# Altium footprint library Connectors THD.PcbLib: 631 footprints (part 21 of 46) (continued)
## HARWIN_M20-7830546 [mm] "10 Contacts, Pitch 2.54mm - Top Entry, Dual Row, Through Mount Socket"
height 8.5
pads (10):
  round 1.7 hole 1: 1(-5.08,1.27) 2(-5.08,-1.27) 3(-2.54,1.27) 4(-2.54,-1.27) 5(0,1.27) 6(0,-1.27) 7(2.54,1.27) 8(2.54,-1.27) 9(5.08,1.27) 10(5.08,-1.27)
Top Overlay:
  circle w0.3: c-5.115,2.935 r0.15
  lines w0.2: -6.55,-2.5 -6.55,2.5 6.55,2.5 6.55,-2.5 -6.55,-2.5
  text "10" at 6.85,-1.85 h1
  text "1" at -7.127,0.772 h1
Mechanical 8:
  lines w0.1: -5.58,-1.27 -5.08,-1.27 ; -5.58,1.27 -5.08,1.27 ; -5.08,-1.77 -5.08,-1.27 ; -5.08,-0.77 -5.08,-1.27 ; -5.08,0.77 -5.08,1.27 ; -5.08,1.77 -5.08,1.27 ; -4.58,-1.27 -5.08,-1.27 ; -4.58,1.27 -5.08,1.27 ; -3.04,-1.27 -2.54,-1.27 ; -3.04,1.27 -2.54,1.27 ; -2.54,-1.77 -2.54,-1.27 ; -2.54,-0.77 -2.54,-1.27 ; -2.54,0.77 -2.54,1.27 ; -2.54,1.77 -2.54,1.27 ; -2.04,-1.27 -2.54,-1.27 ; -2.04,1.27 -2.54,1.27 ; -0.5,-1.27 0,-1.27 ; -0.5,0 0,0 ; -0.5,1.27 0,1.27 ; 0,-1.77 0,-1.27 ; 0,-0.77 0,-1.27 ; 0,-0.5 0,0 ; 0,0.5 0,0 ; 0,0.77 0,1.27 ; 0,1.77 0,1.27 ; 0.5,-1.27 0,-1.27 ; 0.5,0 0,0 ; 0.5,1.27 0,1.27 ; 2.04,-1.27 2.54,-1.27 ; 2.04,1.27 2.54,1.27 ; 2.54,-1.77 2.54,-1.27 ; 2.54,-0.77 2.54,-1.27 ; 2.54,0.77 2.54,1.27 ; 2.54,1.77 2.54,1.27 ; 3.04,-1.27 2.54,-1.27 ; 3.04,1.27 2.54,1.27 ; 4.58,-1.27 5.08,-1.27 ; 4.58,1.27 5.08,1.27 ; 5.08,-1.77 5.08,-1.27 ; 5.08,-0.77 5.08,-1.27 ; 5.08,0.77 5.08,1.27 ; 5.08,1.77 5.08,1.27 ; 5.58,-1.27 5.08,-1.27 ; 5.58,1.27 5.08,1.27
Mechanical 14:
  circle w0.3: c-5.115,2.935 r0.15
  lines w0.1: -5.48,-0.873 -5.98,-0.37 ; -5.48,1.667 -5.98,2.17 ; -2.94,-0.873 -3.44,-0.37 ; -2.94,1.667 -3.44,2.17 ; -0.4,-0.873 -0.9,-0.37 ; -0.4,1.667 -0.9,2.17 ; 2.14,-0.873 1.64,-0.37 ; 2.14,1.667 1.64,2.17 ; 4.68,-0.873 4.18,-0.37 ; 4.68,1.667 4.18,2.17 ; -5.98,-2.17 -5.98,-0.37 ; -5.98,-2.17 -4.18,-2.17 ; -5.98,-2.17 -5.48,-1.67 ; -5.98,-0.37 -4.18,-0.37 ; -5.98,0.37 -5.98,2.17 ; -5.98,0.37 -4.18,0.37 ; -5.98,0.37 -5.48,0.87 ; -5.98,2.17 -4.18,2.17 ; -5.48,-1.67 -4.68,-1.67 ; -5.48,-1.67 -5.48,-0.87 -4.68,-0.87 ; -5.48,0.87 -4.68,0.87 ; -5.48,0.87 -5.48,1.67 -4.68,1.67 ; -4.68,-1.67 -4.18,-2.17 ; -4.68,-1.67 -4.68,-0.87 ; -4.68,-0.87 -4.18,-0.37 ; -4.68,0.87 -4.18,0.37 ; -4.68,0.87 -4.68,1.67 ; -4.68,1.67 -4.18,2.17 ; -4.18,-2.17 -4.18,-0.37 ; -4.18,0.37 -4.18,2.17 ; -3.44,-2.17 -3.44,-0.37 ; -3.44,-2.17 -1.64,-2.17 ; -3.44,-2.17 -2.94,-1.67 ; -3.44,-0.37 -1.64,-0.37 ; -3.44,0.37 -3.44,2.17 ; -3.44,0.37 -1.64,0.37 ; -3.44,0.37 -2.94,0.87 ; -3.44,2.17 -1.64,2.17 ; -2.94,-1.67 -2.14,-1.67 ; -2.94,-1.67 -2.94,-0.87 -2.14,-0.87 ; -2.94,0.87 -2.14,0.87 ; -2.94,0.87 -2.94,1.67 -2.14,1.67 ; -2.14,-1.67 -1.64,-2.17 ; -2.14,-1.67 -2.14,-0.87 ; -2.14,-0.87 -1.64,-0.37 ; -2.14,0.87 -1.64,0.37 ; -2.14,0.87 -2.14,1.67 ; -2.14,1.67 -1.64,2.17 ; -1.64,-2.17 -1.64,-0.37 ; -1.64,0.37 -1.64,2.17 ; -0.9,-2.17 -0.9,-0.37 ; -0.9,-2.17 0.9,-2.17 ; -0.9,-2.17 -0.4,-1.67 ; -0.9,-0.37 0.9,-0.37 ; -0.9,0.37 -0.9,2.17 ; -0.9,0.37 0.9,0.37 ; -0.9,0.37 -0.4,0.87 ; -0.9,2.17 0.9,2.17 ; -0.4,-1.67 0.4,-1.67 ; -0.4,-1.67 -0.4,-0.87 0.4,-0.87 ; -0.4,0.87 0.4,0.87 ; -0.4,0.87 -0.4,1.67 0.4,1.67 ; 0.4,-1.67 0.9,-2.17 ; 0.4,-1.67 0.4,-0.87 ; 0.4,-0.87 0.9,-0.37 ; 0.4,0.87 0.9,0.37 ; 0.4,0.87 0.4,1.67 ; 0.4,1.67 0.9,2.17 ; 0.9,-2.17 0.9,-0.37 ; 0.9,0.37 0.9,2.17 ; 1.64,-2.17 1.64,-0.37 ; 1.64,-2.17 3.44,-2.17 ; 1.64,-2.17 2.14,-1.67 ; 1.64,-0.37 3.44,-0.37 ; 1.64,0.37 1.64,2.17 ; 1.64,0.37 3.44,0.37 ; 1.64,0.37 2.14,0.87 ; 1.64,2.17 3.44,2.17 ; 2.14,-1.67 2.94,-1.67 ; 2.14,-1.67 2.14,-0.87 2.94,-0.87 ; 2.14,0.87 2.94,0.87 ; 2.14,0.87 2.14,1.67 2.94,1.67 ; 2.94,-1.67 3.44,-2.17 ; 2.94,-1.67 2.94,-0.87 ; 2.94,-0.87 3.44,-0.37 ; 2.94,0.87 3.44,0.37 ; 2.94,0.87 2.94,1.67 ; 2.94,1.67 3.44,2.17 ; 3.44,-2.17 3.44,-0.37 ; 3.44,0.37 3.44,2.17 ; 4.18,-2.17 4.18,-0.37 ; 4.18,-2.17 5.98,-2.17 ; 4.18,-2.17 4.68,-1.67 ; 4.18,-0.37 5.98,-0.37 ; 4.18,0.37 4.18,2.17 ; 4.18,0.37 5.98,0.37 ; 4.18,0.37 4.68,0.87 ; 4.18,2.17 5.98,2.17 ; 4.68,-1.67 5.48,-1.67 ; 4.68,-1.67 4.68,-0.87 5.48,-0.87 ; 4.68,0.87 5.48,0.87 ; 4.68,0.87 4.68,1.67 5.48,1.67 ; 5.48,-1.67 5.98,-2.17 ; 5.48,-1.67 5.48,-0.87 ; 5.48,-0.87 5.98,-0.37 ; 5.48,0.87 5.98,0.37 ; 5.48,0.87 5.48,1.67 ; 5.48,1.67 5.98,2.17 ; 5.98,-2.17 5.98,-0.37 ; 5.98,0.37 5.98,2.17 ; -6.55,-2.5 -6.55,2.5 6.55,2.5 6.55,-2.5 -6.55,-2.5
  text "10" at 6.85,-1.85 h1
  text "1" at -7.127,0.772 h1
3D body: height 8.5, standoff -3, extent -6.55,-2.5 6.55,2.5

## HARWIN_M20-9990246 [mm] "2 Contacts, Pitch 2.54mm - Male Vertical Single row Pc tail"
height 8.68
pads (2):
  round 1.7 hole 1: 1(0,0) 2(2.54,0)
Top Overlay:
  circle w0.3: c-0.508,1.778 r0.15
  lines w0.2: 1.27,-0.77 1.77,-1.27 3.31,-1.27 3.81,-0.77 3.81,0.77 3.31,1.27 1.77,1.27 1.27,0.77 ; 1.27,-0.77 0.77,-1.27 -0.77,-1.27 -1.27,-0.77 -1.27,0.77 -0.77,1.27 0.77,1.27 1.27,0.77 ; 1.27,-0.77 1.27,0.77
Mechanical 8:
  lines w0.1: -0.5,0 0,0 ; 0,-0.5 0,0 ; 0,0.5 0,0 ; 0.5,0 0,0 ; 2.04,0 2.54,0 ; 2.54,-0.5 2.54,0 ; 2.54,0.5 2.54,0 ; 3.04,0 2.54,0
Mechanical 14:
  circle w0.3: c-0.508,1.778 r0.15
  lines w0.1: 1.27,-0.77 1.77,-1.27 3.31,-1.27 3.81,-0.77 3.81,0.77 3.31,1.27 1.77,1.27 1.27,0.77 ; 1.27,-0.77 0.77,-1.27 -0.77,-1.27 -1.27,-0.77 -1.27,0.77 -0.77,1.27 0.77,1.27 1.27,0.77 ; 1.27,-0.77 1.27,0.77
3D body: height 8.64, standoff -3.04, extent -1.27,-1.27 3.81,1.27

## HARWIN_M22-F2010605 [mm] "6 Contacts, Pitch 2mm - SIL Vertical Pin Header"
height 5
pads (6):
  round 1.5 hole 0.8: 1(0,0) 2(2,0) 3(4,0) 4(6,0) 5(8,0) 6(10,0)
Top Overlay:
  circle w0.3: c-0.508,1.778 r0.15
  lines w0.2: -1,-0.75 -0.75,-1 0.75,-1 1,-0.75 1.25,-1 2.75,-1 3,-0.75 3.25,-1 4.75,-1 5,-0.75 5.25,-1 6.75,-1 7,-0.75 7.25,-1 8.75,-1 9,-0.75 9.25,-1 10.75,-1 11,-0.75 11,0.75 10.75,1 9.25,1 9,0.75 8.75,1 7.25,1 7,0.75 6.75,1 5.25,1 5,0.75 4.75,1 3.25,1 3,0.75 2.75,1 1.25,1 1,0.75 0.75,1 -0.75,1 -1,0.75 -1,-0.75
Mechanical 8:
  lines w0.1: -0.5,0 0,0 ; 0,-0.5 0,0 ; 0,0.5 0,0 ; 0.5,0 0,0 ; 1.5,0 2,0 ; 2,-0.5 2,0 ; 2,0.5 2,0 ; 2.5,0 2,0 ; 3.5,0 4,0 ; 4,-0.5 4,0 ; 4,0.5 4,0 ; 4.5,0 4,0 ; 5.5,0 6,0 ; 6,-0.5 6,0 ; 6,0.5 6,0 ; 6.5,0 6,0 ; 7.5,0 8,0 ; 8,-0.5 8,0 ; 8,0.5 8,0 ; 8.5,0 8,0 ; 9.5,0 10,0 ; 10,-0.5 10,0 ; 10,0.5 10,0 ; 10.5,0 10,0
Mechanical 14:
  circle w0.3: c-0.508,1.778 r0.15
  lines w0.1: -1,-0.75 -0.75,-1 0.75,-1 1,-0.75 1.25,-1 2.75,-1 3,-0.75 3.25,-1 4.75,-1 5,-0.75 5.25,-1 6.75,-1 7,-0.75 7.25,-1 8.75,-1 9,-0.75 9.25,-1 10.75,-1 11,-0.75 11,0.75 10.75,1 9.25,1 9,0.75 8.75,1 7.25,1 7,0.75 6.75,1 5.25,1 5,0.75 4.75,1 3.25,1 3,0.75 2.75,1 1.25,1 1,0.75 0.75,1 -0.75,1 -1,0.75 -1,-0.75
3D body: height 5, standoff -3.4, extent -1,-1 11,1

## HARWIN_M50-3001045 [mm] "20 Contacts, Pitch 1.27mm - Top Entry, Dual Row Through Mount Socket"
height 4.55
pads (20):
  rrect50% 1.05x1.05 hole 0.65: 1(-5.715,0.635) 2(-5.715,-0.635) 3(-4.445,0.635) 4(-4.445,-0.635) 5(-3.175,0.635) 6(-3.175,-0.635) 7(-1.905,0.635) 8(-1.905,-0.635) 9(-0.635,0.635) 10(-0.635,-0.635) 11(0.635,0.635) 12(0.635,-0.635) 13(1.905,0.635) 14(1.905,-0.635) 15(3.175,0.635) 16(3.175,-0.635) 17(4.445,0.635) 18(4.445,-0.635) 19(5.715,0.635) 20(5.715,-0.635)
Top Overlay:
  circle w0.3: c-5.75,2 r0.15
  lines w0.2: -6.75,-1.625 6.75,-1.625 6.75,1.625 -6.75,1.625 -6.75,-1.625
  text "20" at 7,-1.1 h1
  text "1" at -7.362,0.162 h1
Mechanical 8:
  lines w0.1: -6.215,-0.635 -5.715,-0.635 ; -6.215,0.635 -5.715,0.635 ; -5.715,-1.135 -5.715,-0.635 ; -5.715,-0.135 -5.715,-0.635 ; -5.715,0.135 -5.715,0.635 ; -5.715,1.135 -5.715,0.635 ; -5.215,-0.635 -5.715,-0.635 ; -5.215,0.635 -5.715,0.635 ; -4.945,-0.635 -4.445,-0.635 ; -4.945,0.635 -4.445,0.635 ; -4.445,-1.135 -4.445,-0.635 ; -4.445,-0.135 -4.445,-0.635 ; -4.445,0.135 -4.445,0.635 ; -4.445,1.135 -4.445,0.635 ; -3.945,-0.635 -4.445,-0.635 ; -3.945,0.635 -4.445,0.635 ; -3.675,-0.635 -3.175,-0.635 ; -3.675,0.635 -3.175,0.635 ; -3.175,-1.135 -3.175,-0.635 ; -3.175,-0.135 -3.175,-0.635 ; -3.175,0.135 -3.175,0.635 ; -3.175,1.135 -3.175,0.635 ; -2.675,-0.635 -3.175,-0.635 ; -2.675,0.635 -3.175,0.635 ; -2.405,-0.635 -1.905,-0.635 ; -2.405,0.635 -1.905,0.635 ; -1.905,-1.135 -1.905,-0.635 ; -1.905,-0.135 -1.905,-0.635 ; -1.905,0.135 -1.905,0.635 ; -1.905,1.135 -1.905,0.635 ; -1.405,-0.635 -1.905,-0.635 ; -1.405,0.635 -1.905,0.635 ; -1.135,-0.635 -0.635,-0.635 ; -1.135,0.635 -0.635,0.635 ; -1,0 0,0 ; -0.635,-1.135 -0.635,-0.635 ; -0.635,-0.135 -0.635,-0.635 ; -0.635,0.135 -0.635,0.635 ; -0.635,1.135 -0.635,0.635 ; -0.135,-0.635 -0.635,-0.635 ; -0.135,0.635 -0.635,0.635 ; 0,-1 0,0 ; 0,1 0,0 ; 0.135,-0.635 0.635,-0.635 ; 0.135,0.635 0.635,0.635 ; 0.635,-1.135 0.635,-0.635 ; 0.635,-0.135 0.635,-0.635 ; 0.635,0.135 0.635,0.635 ; 0.635,1.135 0.635,0.635 ; 1,0 0,0 ; 1.135,-0.635 0.635,-0.635 ; 1.135,0.635 0.635,0.635 ; 1.405,-0.635 1.905,-0.635 ; 1.405,0.635 1.905,0.635 ; 1.905,-1.135 1.905,-0.635 ; 1.905,-0.135 1.905,-0.635 ; 1.905,0.135 1.905,0.635 ; 1.905,1.135 1.905,0.635 ; 2.405,-0.635 1.905,-0.635 ; 2.405,0.635 1.905,0.635 ; 2.675,-0.635 3.175,-0.635 ; 2.675,0.635 3.175,0.635 ; 3.175,-1.135 3.175,-0.635 ; 3.175,-0.135 3.175,-0.635 ; 3.175,0.135 3.175,0.635 ; 3.175,1.135 3.175,0.635 ; 3.675,-0.635 3.175,-0.635 ; 3.675,0.635 3.175,0.635 ; 3.945,-0.635 4.445,-0.635 ; 3.945,0.635 4.445,0.635 ; 4.445,-1.135 4.445,-0.635 ; 4.445,-0.135 4.445,-0.635 ; 4.445,0.135 4.445,0.635 ; 4.445,1.135 4.445,0.635 ; 4.945,-0.635 4.445,-0.635 ; 4.945,0.635 4.445,0.635 ; 5.215,-0.635 5.715,-0.635 ; 5.215,0.635 5.715,0.635 ; 5.715,-1.135 5.715,-0.635 ; 5.715,-0.135 5.715,-0.635 ; 5.715,0.135 5.715,0.635 ; 5.715,1.135 5.715,0.635 ; 6.215,-0.635 5.715,-0.635 ; 6.215,0.635 5.715,0.635
Mechanical 14:
  drawing of 245 lines, arcs and shapes, not listed
  text "20" at 7,-1.1 h1
  text "1" at -7.362,0.162 h1
3D body: height 4.55, standoff -2.4, extent -6.75,-1.625 6.75,1.625

## HARWIN_M50-3501042 [mm] "20 Contacts, Pitch 1.27mm - Horizontal, Dual Row Through Mount Right Angle Straight Header"
height 4.15
pads (20):
  rrect50% 1.05x1.05 hole 0.65: 1(-5.715,-0.635) 2(-5.715,0.635) 3(-4.445,-0.635) 4(-4.445,0.635) 5(-3.175,-0.635) 6(-3.175,0.635) 7(-1.905,-0.635) 8(-1.905,0.635) 9(-0.635,-0.635) 10(-0.635,0.635) 11(0.635,-0.635) 12(0.635,0.635) 13(1.905,-0.635) 14(1.905,0.635) 15(3.175,-0.635) 16(3.175,0.635) 17(4.445,-0.635) 18(4.445,0.635) 19(5.715,-0.635) 20(5.715,0.635)
Top Overlay:
  circle w0.3: c-5.725,-2.275 r0.15
  lines w0.2: -6.35,-1.308 -6.35,-1.7 6.35,-1.7 6.35,-1.308 ; -6.35,1.308 -6.35,1.7 6.35,1.7 6.35,1.308
  text "1" at -6.862,-1.038 h0.8
  text "20" at 6.5,0.2 h0.8
Mechanical 8:
  lines w0.1: -6.215,-0.635 -5.715,-0.635 ; -6.215,0.635 -5.715,0.635 ; -5.715,-1.135 -5.715,-0.635 ; -5.715,-0.135 -5.715,-0.635 ; -5.715,0.135 -5.715,0.635 ; -5.715,1.135 -5.715,0.635 ; -5.215,-0.635 -5.715,-0.635 ; -5.215,0.635 -5.715,0.635 ; -4.945,-0.635 -4.445,-0.635 ; -4.945,0.635 -4.445,0.635 ; -4.445,-1.135 -4.445,-0.635 ; -4.445,-0.135 -4.445,-0.635 ; -4.445,0.135 -4.445,0.635 ; -4.445,1.135 -4.445,0.635 ; -3.945,-0.635 -4.445,-0.635 ; -3.945,0.635 -4.445,0.635 ; -3.675,-0.635 -3.175,-0.635 ; -3.675,0.635 -3.175,0.635 ; -3.175,-1.135 -3.175,-0.635 ; -3.175,-0.135 -3.175,-0.635 ; -3.175,0.135 -3.175,0.635 ; -3.175,1.135 -3.175,0.635 ; -2.675,-0.635 -3.175,-0.635 ; -2.675,0.635 -3.175,0.635 ; -2.405,-0.635 -1.905,-0.635 ; -2.405,0.635 -1.905,0.635 ; -1.905,-1.135 -1.905,-0.635 ; -1.905,-0.135 -1.905,-0.635 ; -1.905,0.135 -1.905,0.635 ; -1.905,1.135 -1.905,0.635 ; -1.405,-0.635 -1.905,-0.635 ; -1.405,0.635 -1.905,0.635 ; -1.135,-0.635 -0.635,-0.635 ; -1.135,0.635 -0.635,0.635 ; -1,0 0,0 ; -0.635,-1.135 -0.635,-0.635 ; -0.635,-0.135 -0.635,-0.635 ; -0.635,0.135 -0.635,0.635 ; -0.635,1.135 -0.635,0.635 ; -0.135,-0.635 -0.635,-0.635 ; -0.135,0.635 -0.635,0.635 ; 0,-1 0,0 ; 0,1 0,0 ; 0.135,-0.635 0.635,-0.635 ; 0.135,0.635 0.635,0.635 ; 0.635,-1.135 0.635,-0.635 ; 0.635,-0.135 0.635,-0.635 ; 0.635,0.135 0.635,0.635 ; 0.635,1.135 0.635,0.635 ; 1,0 0,0 ; 1.135,-0.635 0.635,-0.635 ; 1.135,0.635 0.635,0.635 ; 1.405,-0.635 1.905,-0.635 ; 1.405,0.635 1.905,0.635 ; 1.905,-1.135 1.905,-0.635 ; 1.905,-0.135 1.905,-0.635 ; 1.905,0.135 1.905,0.635 ; 1.905,1.135 1.905,0.635 ; 2.405,-0.635 1.905,-0.635 ; 2.405,0.635 1.905,0.635 ; 2.675,-0.635 3.175,-0.635 ; 2.675,0.635 3.175,0.635 ; 3.175,-1.135 3.175,-0.635 ; 3.175,-0.135 3.175,-0.635 ; 3.175,0.135 3.175,0.635 ; 3.175,1.135 3.175,0.635 ; 3.675,-0.635 3.175,-0.635 ; 3.675,0.635 3.175,0.635 ; 3.945,-0.635 4.445,-0.635 ; 3.945,0.635 4.445,0.635 ; 4.445,-1.135 4.445,-0.635 ; 4.445,-0.135 4.445,-0.635 ; 4.445,0.135 4.445,0.635 ; 4.445,1.135 4.445,0.635 ; 4.945,-0.635 4.445,-0.635 ; 4.945,0.635 4.445,0.635 ; 5.215,-0.635 5.715,-0.635 ; 5.215,0.635 5.715,0.635 ; 5.715,-1.135 5.715,-0.635 ; 5.715,-0.135 5.715,-0.635 ; 5.715,0.135 5.715,0.635 ; 5.715,1.135 5.715,0.635 ; 6.215,-0.635 5.715,-0.635 ; 6.215,0.635 5.715,0.635
Mechanical 14:
  drawing of 254 lines, arcs and shapes, not listed
  text "1" at -6.862,-1.038 h0.8
  text "20" at 6.5,0.2 h0.8
3D body: height 4, standoff -2.3, extent -6.35,-1.7 6.35,1.7

## HARWIN_M50-3901042 [mm] "20 Contacts, Pitch 1.27mm - Horizontal, Dual Row Through Mount Right Angle Header"
height 3.41
pads (20):
  rrect50% 1.05x1.05 hole 0.65: 1(-5.715,-0.635) 2(-5.715,0.635) 3(-4.445,-0.635) 4(-4.445,0.635) 5(-3.175,-0.635) 6(-3.175,0.635) 7(-1.905,-0.635) 8(-1.905,0.635) 9(-0.635,-0.635) 10(-0.635,0.635) 11(0.635,-0.635) 12(0.635,0.635) 13(1.905,-0.635) 14(1.905,0.635) 15(3.175,-0.635) 16(3.175,0.635) 17(4.445,-0.635) 18(4.445,0.635) 19(5.715,-0.635) 20(5.715,0.635)
Top Overlay:
  circle w0.3: c-5.75,-1.6 r0.15
  lines w0.2: -5.915,3.135 -5.915,1.41 -5.515,1.41 -5.515,3.135 ; -5.915,4.135 -5.915,7.835 ; -5.515,4.135 -5.515,7.835 ; -4.645,3.135 -4.645,1.41 -4.245,1.41 -4.245,3.135 ; -4.645,4.135 -4.645,7.835 ; -4.245,4.135 -4.245,7.835 ; -3.375,3.135 -3.375,1.41 -2.975,1.41 -2.975,3.135 ; -3.375,4.135 -3.375,7.835 ; -2.975,4.135 -2.975,7.835 ; -2.105,3.135 -2.105,1.41 -1.705,1.41 -1.705,3.135 ; -2.105,4.135 -2.105,7.835 ; -1.705,4.135 -1.705,7.835 ; -0.835,3.135 -0.835,1.41 -0.435,1.41 -0.435,3.135 ; -0.835,4.135 -0.835,7.835 ; -0.435,4.135 -0.435,7.835 ; 0.435,3.135 0.435,1.41 0.835,1.41 0.835,3.135 ; 0.435,4.135 0.435,7.835 ; 0.835,4.135 0.835,7.835 ; 1.705,3.135 1.705,1.41 2.105,1.41 2.105,3.135 ; 1.705,4.135 1.705,7.835 ; 2.105,4.135 2.105,7.835 ; 2.975,3.135 2.975,1.41 3.375,1.41 3.375,3.135 ; 2.975,4.135 2.975,7.835 ; 3.375,4.135 3.375,7.835 ; 4.245,3.135 4.245,1.41 4.645,1.41 4.645,3.135 ; 4.245,4.135 4.245,7.835 ; 4.645,4.135 4.645,7.835 ; 5.515,3.135 5.515,1.41 5.915,1.41 5.915,3.135 ; 5.515,4.135 5.515,7.835 ; 5.915,4.135 5.915,7.835 ; -6.3,3.135 -5.13,3.135 -5.03,3.235 -4.93,3.135 -3.86,3.135 -3.76,3.235 -3.66,3.135 -2.59,3.135 -2.49,3.235 -2.39,3.135 -1.32,3.135 -1.22,3.235 -1.12,3.135 -0.05,3.135 0.05,3.235 0.15,3.135 1.22,3.135 1.32,3.235 1.42,3.135 2.49,3.135 2.59,3.235 2.69,3.135 3.76,3.135 3.86,3.235 3.96,3.135 5.03,3.135 5.13,3.235 5.23,3.135 6.4,3.135 6.4,4.135 5.23,4.135 5.13,4.035 5.03,4.135 3.96,4.135 3.86,4.035 3.76,4.135 2.69,4.135 2.59,4.035 2.49,4.135 1.42,4.135 1.32,4.035 1.22,4.135 0.15,4.135 0.05,4.035 -0.05,4.135 -1.12,4.135 -1.22,4.035 -1.32,4.135 -2.39,4.135 -2.49,4.035 -2.59,4.135 -3.66,4.135 -3.76,4.035 -3.86,4.135 -4.93,4.135 -5.03,4.035 -5.13,4.135 -6.3,4.135 ; -6.3,3.135 -6.3,4.135 ; -6.3,3.135 -6.3,4.135 ; -5.915,7.835 -5.515,7.835 ; -5.915,7.835 -5.815,7.935 -5.615,7.935 -5.515,7.835 ; -4.645,7.835 -4.245,7.835 ; -4.645,7.835 -4.545,7.935 -4.345,7.935 -4.245,7.835 ; -3.375,7.835 -2.975,7.835 ; -3.375,7.835 -3.275,7.935 -3.075,7.935 -2.975,7.835 ; -2.105,7.835 -1.705,7.835 ; -2.105,7.835 -2.005,7.935 -1.805,7.935 -1.705,7.835 ; -0.835,7.835 -0.435,7.835 ; -0.835,7.835 -0.735,7.935 -0.535,7.935 -0.435,7.835 ; 0.435,7.835 0.835,7.835 ; 0.435,7.835 0.535,7.935 0.735,7.935 0.835,7.835 ; 1.705,7.835 2.105,7.835 ; 1.705,7.835 1.805,7.935 2.005,7.935 2.105,7.835 ; 2.975,7.835 3.375,7.835 ; 2.975,7.835 3.075,7.935 3.275,7.935 3.375,7.835 ; 4.245,7.835 4.645,7.835 ; 4.245,7.835 4.345,7.935 4.545,7.935 4.645,7.835 ; 5.515,7.835 5.915,7.835 ; 5.515,7.835 5.615,7.935 5.815,7.935 5.915,7.835
  text "1" at -6.862,-1.038 h0.8
  text "20" at 6.5,0.2 h0.8
Mechanical 8:
  lines w0.1: -6.215,-0.635 -5.715,-0.635 ; -6.215,0.635 -5.715,0.635 ; -5.715,-1.135 -5.715,-0.635 ; -5.715,-0.135 -5.715,-0.635 ; -5.715,0.135 -5.715,0.635 ; -5.715,1.135 -5.715,0.635 ; -5.215,-0.635 -5.715,-0.635 ; -5.215,0.635 -5.715,0.635 ; -4.945,-0.635 -4.445,-0.635 ; -4.945,0.635 -4.445,0.635 ; -4.445,-1.135 -4.445,-0.635 ; -4.445,-0.135 -4.445,-0.635 ; -4.445,0.135 -4.445,0.635 ; -4.445,1.135 -4.445,0.635 ; -3.945,-0.635 -4.445,-0.635 ; -3.945,0.635 -4.445,0.635 ; -3.675,-0.635 -3.175,-0.635 ; -3.675,0.635 -3.175,0.635 ; -3.175,-1.135 -3.175,-0.635 ; -3.175,-0.135 -3.175,-0.635 ; -3.175,0.135 -3.175,0.635 ; -3.175,1.135 -3.175,0.635 ; -2.675,-0.635 -3.175,-0.635 ; -2.675,0.635 -3.175,0.635 ; -2.405,-0.635 -1.905,-0.635 ; -2.405,0.635 -1.905,0.635 ; -1.905,-1.135 -1.905,-0.635 ; -1.905,-0.135 -1.905,-0.635 ; -1.905,0.135 -1.905,0.635 ; -1.905,1.135 -1.905,0.635 ; -1.405,-0.635 -1.905,-0.635 ; -1.405,0.635 -1.905,0.635 ; -1.135,-0.635 -0.635,-0.635 ; -1.135,0.635 -0.635,0.635 ; -1,0 0,0 ; -0.635,-1.135 -0.635,-0.635 ; -0.635,-0.135 -0.635,-0.635 ; -0.635,0.135 -0.635,0.635 ; -0.635,1.135 -0.635,0.635 ; -0.135,-0.635 -0.635,-0.635 ; -0.135,0.635 -0.635,0.635 ; 0,-1 0,0 ; 0,1 0,0 ; 0.135,-0.635 0.635,-0.635 ; 0.135,0.635 0.635,0.635 ; 0.635,-1.135 0.635,-0.635 ; 0.635,-0.135 0.635,-0.635 ; 0.635,0.135 0.635,0.635 ; 0.635,1.135 0.635,0.635 ; 1,0 0,0 ; 1.135,-0.635 0.635,-0.635 ; 1.135,0.635 0.635,0.635 ; 1.405,-0.635 1.905,-0.635 ; 1.405,0.635 1.905,0.635 ; 1.905,-1.135 1.905,-0.635 ; 1.905,-0.135 1.905,-0.635 ; 1.905,0.135 1.905,0.635 ; 1.905,1.135 1.905,0.635 ; 2.405,-0.635 1.905,-0.635 ; 2.405,0.635 1.905,0.635 ; 2.675,-0.635 3.175,-0.635 ; 2.675,0.635 3.175,0.635 ; 3.175,-1.135 3.175,-0.635 ; 3.175,-0.135 3.175,-0.635 ; 3.175,0.135 3.175,0.635 ; 3.175,1.135 3.175,0.635 ; 3.675,-0.635 3.175,-0.635 ; 3.675,0.635 3.175,0.635 ; 3.945,-0.635 4.445,-0.635 ; 3.945,0.635 4.445,0.635 ; 4.445,-1.135 4.445,-0.635 ; 4.445,-0.135 4.445,-0.635 ; 4.445,0.135 4.445,0.635 ; 4.445,1.135 4.445,0.635 ; 4.945,-0.635 4.445,-0.635 ; 4.945,0.635 4.445,0.635 ; 5.215,-0.635 5.715,-0.635 ; 5.215,0.635 5.715,0.635 ; 5.715,-1.135 5.715,-0.635 ; 5.715,-0.135 5.715,-0.635 ; 5.715,0.135 5.715,0.635 ; 5.715,1.135 5.715,0.635 ; 6.215,-0.635 5.715,-0.635 ; 6.215,0.635 5.715,0.635
Mechanical 14:
  circle w0.3: c-5.75,-1.6 r0.15
  lines w0.1: -5.915,3.135 -5.915,-0.835 -5.515,-0.835 -5.515,3.135 ; -5.915,4.135 -5.915,7.835 ; -5.515,4.135 -5.515,7.835 ; -4.645,3.135 -4.645,-0.835 -4.245,-0.835 -4.245,3.135 ; -4.645,4.135 -4.645,7.835 ; -4.245,4.135 -4.245,7.835 ; -3.375,3.135 -3.375,-0.835 -2.975,-0.835 -2.975,3.135 ; -3.375,4.135 -3.375,7.835 ; -2.975,4.135 -2.975,7.835 ; -2.105,3.135 -2.105,-0.835 -1.705,-0.835 -1.705,3.135 ; -2.105,4.135 -2.105,7.835 ; -1.705,4.135 -1.705,7.835 ; -0.835,3.135 -0.835,-0.835 -0.435,-0.835 -0.435,3.135 ; -0.835,4.135 -0.835,7.835 ; -0.435,4.135 -0.435,7.835 ; 0.435,3.135 0.435,-0.835 0.835,-0.835 0.835,3.135 ; 0.435,4.135 0.435,7.835 ; 0.835,4.135 0.835,7.835 ; 1.705,3.135 1.705,-0.835 2.105,-0.835 2.105,3.135 ; 1.705,4.135 1.705,7.835 ; 2.105,4.135 2.105,7.835 ; 2.975,3.135 2.975,-0.835 3.375,-0.835 3.375,3.135 ; 2.975,4.135 2.975,7.835 ; 3.375,4.135 3.375,7.835 ; 4.245,3.135 4.245,-0.835 4.645,-0.835 4.645,3.135 ; 4.245,4.135 4.245,7.835 ; 4.645,4.135 4.645,7.835 ; 5.515,3.135 5.515,-0.835 5.915,-0.835 5.915,3.135 ; 5.515,4.135 5.515,7.835 ; 5.915,4.135 5.915,7.835 ; -6.3,3.135 -6.3,4.135 ; -6.3,3.135 -5.13,3.135 -5.03,3.235 -4.93,3.135 -3.86,3.135 -3.76,3.235 -3.66,3.135 -2.59,3.135 -2.49,3.235 -2.39,3.135 -1.32,3.135 -1.22,3.235 -1.12,3.135 -0.05,3.135 0.05,3.235 0.15,3.135 1.22,3.135 1.32,3.235 1.42,3.135 2.49,3.135 2.59,3.235 2.69,3.135 3.76,3.135 3.86,3.235 3.96,3.135 5.03,3.135 5.13,3.235 5.23,3.135 6.4,3.135 6.4,4.135 5.23,4.135 5.13,4.035 5.03,4.135 3.96,4.135 3.86,4.035 3.76,4.135 2.69,4.135 2.59,4.035 2.49,4.135 1.42,4.135 1.32,4.035 1.22,4.135 0.15,4.135 0.05,4.035 -0.05,4.135 -1.12,4.135 -1.22,4.035 -1.32,4.135 -2.39,4.135 -2.49,4.035 -2.59,4.135 -3.66,4.135 -3.76,4.035 -3.86,4.135 -4.93,4.135 -5.03,4.035 -5.13,4.135 -6.3,4.135 ; -6.3,3.135 -6.3,4.135 ; -5.915,7.835 -5.515,7.835 ; -5.915,7.835 -5.815,7.935 -5.615,7.935 -5.515,7.835 ; -4.645,7.835 -4.245,7.835 ; -4.645,7.835 -4.545,7.935 -4.345,7.935 -4.245,7.835 ; -3.375,7.835 -2.975,7.835 ; -3.375,7.835 -3.275,7.935 -3.075,7.935 -2.975,7.835 ; -2.105,7.835 -1.705,7.835 ; -2.105,7.835 -2.005,7.935 -1.805,7.935 -1.705,7.835 ; -0.835,7.835 -0.435,7.835 ; -0.835,7.835 -0.735,7.935 -0.535,7.935 -0.435,7.835 ; 0.435,7.835 0.835,7.835 ; 0.435,7.835 0.535,7.935 0.735,7.935 0.835,7.835 ; 1.705,7.835 2.105,7.835 ; 1.705,7.835 1.805,7.935 2.005,7.935 2.105,7.835 ; 2.975,7.835 3.375,7.835 ; 2.975,7.835 3.075,7.935 3.275,7.935 3.375,7.835 ; 4.245,7.835 4.645,7.835 ; 4.245,7.835 4.345,7.935 4.545,7.935 4.645,7.835 ; 5.515,7.835 5.915,7.835 ; 5.515,7.835 5.615,7.935 5.815,7.935 5.915,7.835
  text "1" at -6.862,-1.038 h0.8
  text "20" at 6.5,0.2 h0.8
3D body: height 3.41, standoff -2, extent -6.3,-0.835 6.4,7.935

## HARWIN_M52-5001545 [mm] "1.27mm Pitch SIL Vertical PC Tail Socket"
height 4.8
pads (15):
  rrect50% 1.05x1.05 hole 0.65: 1(0,0) 2(1.27,0) 3(2.54,0) 4(3.81,0) 5(5.08,0) 6(6.35,0) 7(7.62,0) 8(8.89,0) 9(10.16,0) 10(11.43,0) 11(12.7,0) 12(13.97,0) 13(15.24,0) 14(16.51,0) 15(17.78,0)
Top Overlay:
  circle w0.3: c-0.508,1.778 r0.15
  lines w0.2: -0.635,-0.773 -0.635,-1.05 -0.385,-1.3 0.385,-1.3 0.635,-1.05 0.885,-1.3 1.655,-1.3 1.905,-1.05 2.155,-1.3 2.925,-1.3 3.175,-1.05 3.425,-1.3 4.195,-1.3 4.445,-1.05 4.695,-1.3 5.465,-1.3 5.715,-1.05 5.965,-1.3 6.735,-1.3 6.985,-1.05 7.235,-1.3 8.005,-1.3 8.255,-1.05 8.505,-1.3 9.275,-1.3 9.525,-1.05 9.775,-1.3 10.545,-1.3 10.795,-1.05 11.045,-1.3 11.815,-1.3 12.065,-1.05 12.315,-1.3 13.085,-1.3 13.335,-1.05 13.585,-1.3 14.355,-1.3 14.605,-1.05 14.855,-1.3 15.625,-1.3 15.875,-1.05 16.125,-1.3 16.895,-1.3 17.145,-1.05 17.395,-1.3 18.165,-1.3 18.415,-1.05 18.415,-0.773 ; -0.635,0.773 -0.635,1.05 -0.385,1.3 0.385,1.3 0.635,1.05 0.885,1.3 1.655,1.3 1.905,1.05 2.155,1.3 2.925,1.3 3.175,1.05 3.425,1.3 4.195,1.3 4.445,1.05 4.695,1.3 5.465,1.3 5.715,1.05 5.965,1.3 6.735,1.3 6.985,1.05 7.235,1.3 8.005,1.3 8.255,1.05 8.505,1.3 9.275,1.3 9.525,1.05 9.775,1.3 10.545,1.3 10.795,1.05 11.045,1.3 11.815,1.3 12.065,1.05 12.315,1.3 13.085,1.3 13.335,1.05 13.585,1.3 14.355,1.3 14.605,1.05 14.855,1.3 15.625,1.3 15.875,1.05 16.125,1.3 16.895,1.3 17.145,1.05 17.395,1.3 18.165,1.3 18.415,1.05 18.415,0.773
Mechanical 8:
  lines w0.1: -0.5,0 0,0 ; 0,-0.5 0,0 ; 0,0.5 0,0 ; 0.5,0 0,0 ; 0.77,0 1.27,0 ; 1.27,-0.5 1.27,0 ; 1.27,0.5 1.27,0 ; 1.77,0 1.27,0 ; 2.04,0 2.54,0 ; 2.54,-0.5 2.54,0 ; 2.54,0.5 2.54,0 ; 3.04,0 2.54,0 ; 3.31,0 3.81,0 ; 3.81,-0.5 3.81,0 ; 3.81,0.5 3.81,0 ; 4.31,0 3.81,0 ; 4.58,0 5.08,0 ; 5.08,-0.5 5.08,0 ; 5.08,0.5 5.08,0 ; 5.58,0 5.08,0 ; 5.85,0 6.35,0 ; 6.35,-0.5 6.35,0 ; 6.35,0.5 6.35,0 ; 6.85,0 6.35,0 ; 7.12,0 7.62,0 ; 7.62,-0.5 7.62,0 ; 7.62,0.5 7.62,0 ; 8.12,0 7.62,0 ; 8.39,0 8.89,0 ; 8.89,-0.5 8.89,0 ; 8.89,0.5 8.89,0 ; 9.39,0 8.89,0 ; 9.66,0 10.16,0 ; 10.16,-0.5 10.16,0 ; 10.16,0.5 10.16,0 ; 10.66,0 10.16,0 ; 10.93,0 11.43,0 ; 11.43,-0.5 11.43,0 ; 11.43,0.5 11.43,0 ; 11.93,0 11.43,0 ; 12.2,0 12.7,0 ; 12.7,-0.5 12.7,0 ; 12.7,0.5 12.7,0 ; 13.2,0 12.7,0 ; 13.47,0 13.97,0 ; 13.97,-0.5 13.97,0 ; 13.97,0.5 13.97,0 ; 14.47,0 13.97,0 ; 14.74,0 15.24,0 ; 15.24,-0.5 15.24,0 ; 15.24,0.5 15.24,0 ; 15.74,0 15.24,0 ; 16.01,0 16.51,0 ; 16.51,-0.5 16.51,0 ; 16.51,0.5 16.51,0 ; 17.01,0 16.51,0 ; 17.28,0 17.78,0 ; 17.78,-0.5 17.78,0 ; 17.78,0.5 17.78,0 ; 18.28,0 17.78,0
Mechanical 14:
  drawing of 153 lines, arcs and shapes, not listed
3D body: height 4.6, standoff -3, extent -0.635,-1.3 18.415,1.3